# Altium footprint library Tomra_Cadstar_Footprints.PcbLib: 380 footprints (part 20 of 24)
Each footprint in its own frame and in the unit in brackets; x right, y up, seen from the top. Pads: shape width x height; smd on the part's side, far side on the other; paste and mask are expansions set on the pad; w line width, h text height; cw(c..) or ccw(c..) is an arc to the next point about the centre after c.
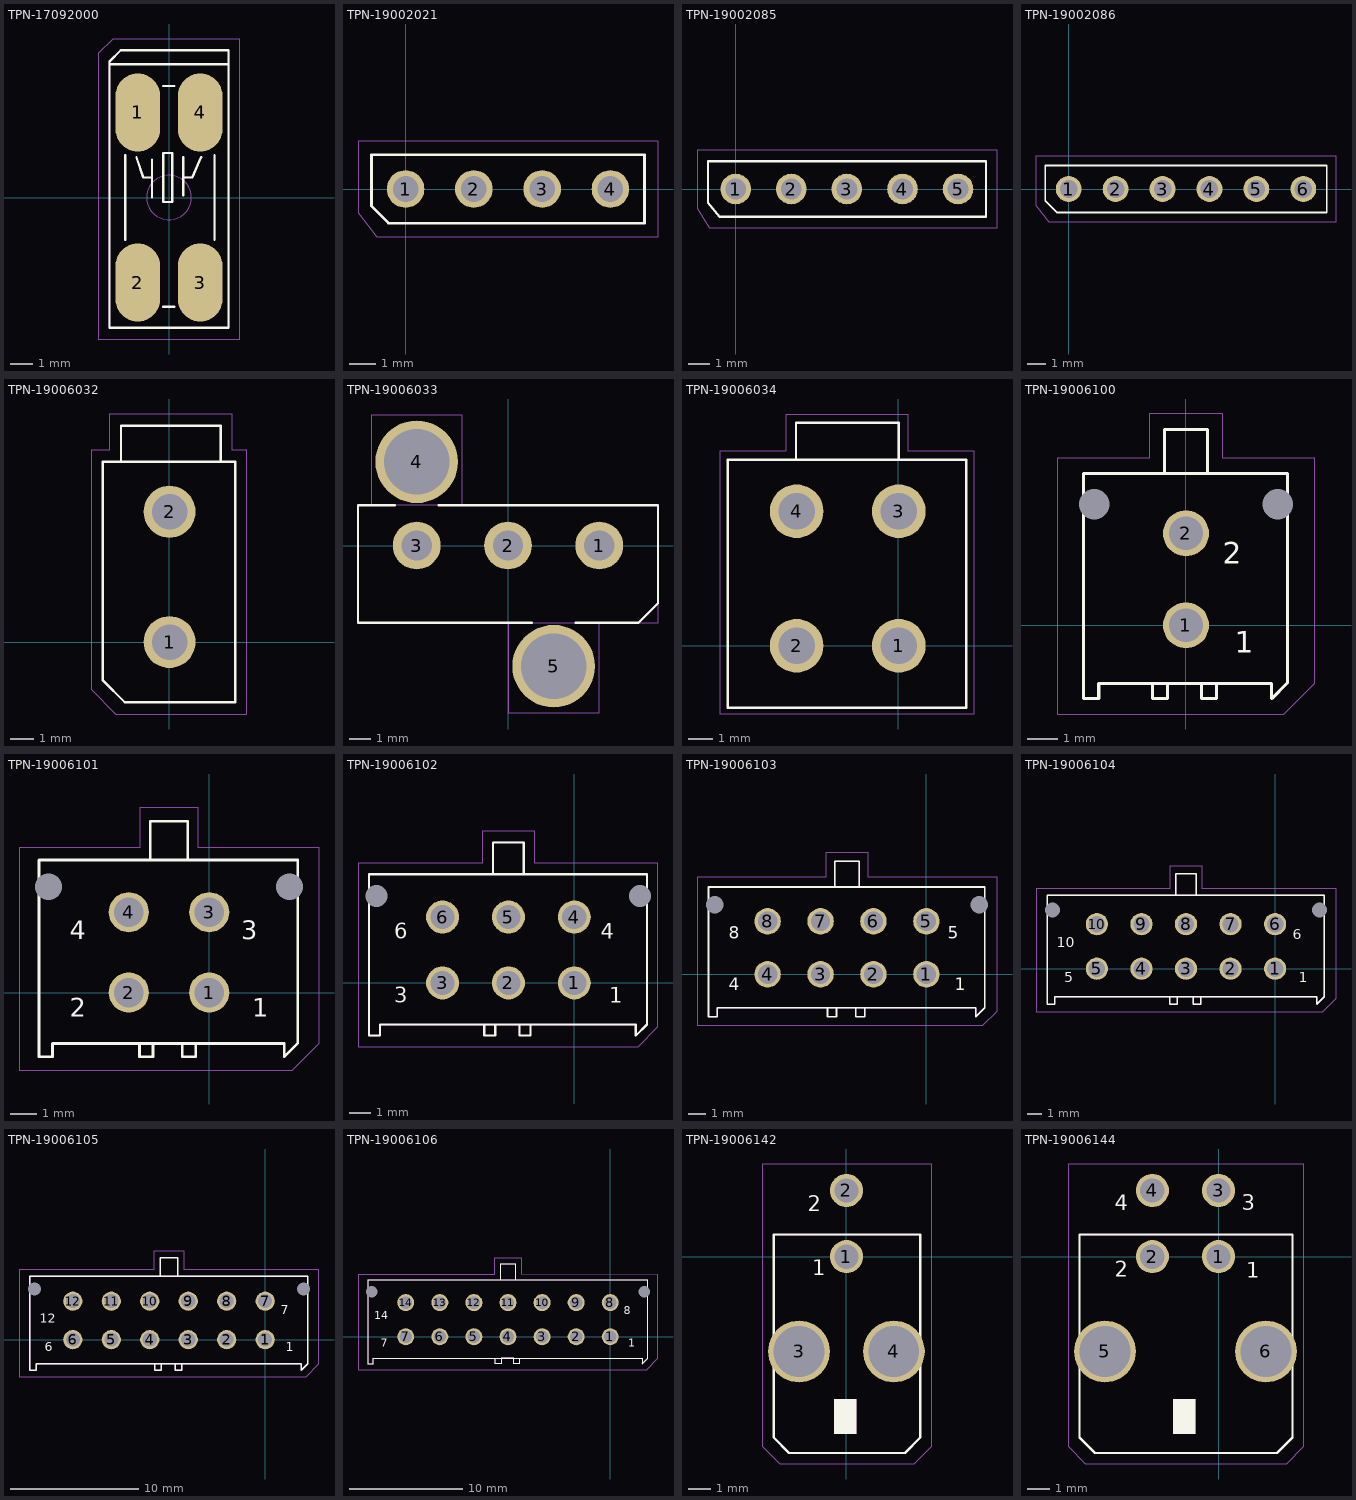
[diagram p19: the footprints below, top view; thin cyan lines are the x and y axes]

## TPN-17092000 [mm]
height 2.5
pads (4):
  oval 2x3.5 smd paste+0 mask+0: 1(-1.397,3.81) 2(-1.397,-3.81) 3(1.397,-3.81) 4(1.397,3.81)
Top Silk:
  lines w0.1: -1.957,-1.9 -1.957,1.9 ; -1.457,1.8 -1.157,0.9 -0.757,0.9 ; -0.757,0 -0.757,1.7 ; -0.257,-4.9 0.243,-4.9 ; -0.257,5 0.243,5 ; 0.643,0.1 0.643,1.8 ; 0.643,0.9 1.043,0.9 1.443,1.8 ; 2.043,-1.9 2.043,1.9 ; -2.667,6.1 -2.163,6.604 ; -2.667,6.1 -2.667,-5.842 2.667,-5.842 2.667,6.604 ; -2.667,6.1 -2.667,5.969 2.667,5.969 2.667,6.604 ; -2.667,6.1 -2.163,6.604 ; -2.163,6.604 2.667,6.604 ; -2.163,6.604 2.667,6.604 ; -0.257,-0.2 0.143,-0.2 0.143,2 -0.257,2 -0.257,-0.2
  text ".Designator" at -0.219,3.624 h0.7
Drill:
  lines w0.05: -1,0 cw(c0,0) 1,0 cw(c0,0) -1,0
Top Assembly:
  lines w0.05: -1.957,-1.9 -1.957,1.9 ; -1.457,1.8 -1.157,0.9 -0.757,0.9 ; -0.757,0 -0.757,1.7 ; -0.257,-4.9 0.243,-4.9 ; -0.257,5 0.243,5 ; 0.643,0.1 0.643,1.8 ; 0.643,0.9 1.043,0.9 1.443,1.8 ; 2.043,-1.9 2.043,1.9 ; -2.667,6.1 -2.667,5.969 2.667,5.969 2.667,6.604 ; -2.667,6.1 -2.163,6.604 ; -2.667,6.1 -2.163,6.604 ; -2.667,6.1 -2.667,-5.842 2.667,-5.842 2.667,6.604 ; -2.163,6.604 2.667,6.604 ; -2.163,6.604 2.667,6.604 ; -0.257,-0.2 0.143,-0.2 0.143,2 -0.257,2 -0.257,-0.2
Top Placement:
  lines w0.01: -3.167,-6.342 3.167,-6.342 3.167,7.104 -2.519,7.104 -3.167,6.456 -3.167,-6.342

## TPN-19002021 [mm]
height 9
pads (4):
  round 1.4 / inner round 1.524 / far side round 1.4 hole 0.95 paste+0 mask+0: 1(0,0) 2(2.54,0) 3(5.08,0) 4(7.62,0)
Top Silk:
  lines w0.1: -1.27,-0.635 -0.635,-1.27 8.89,-1.27 8.89,1.27 -1.27,1.27 -1.27,-0.635
  text ".Designator" at 0,0 h0.7
Top Assembly:
  lines w0.05: -1.27,-0.635 -0.635,-1.27 8.89,-1.27 8.89,1.27 -1.27,1.27 -1.27,-0.635
Top Placement:
  lines w0.01: -1.77,-0.885 -1.072,-1.77 9.39,-1.77 9.39,1.77 -1.77,1.77 -1.77,-0.885

## TPN-19002085 [mm]
height 9
pads (5):
  round 1.4 / inner round 1.524 / far side round 1.4 hole 0.95 paste+0 mask+0: 1(0,0) 2(2.54,0) 3(5.08,0) 4(7.62,0) 5(10.16,0)
Top Silk:
  lines w0.1: -1.27,-0.635 -0.74,-1.27 11.44,-1.27 11.44,1.27 -1.27,1.27 -1.27,-0.635
  text ".Designator" at 0,0 h0.7
Top Assembly:
  lines w0.05: -1.27,-0.635 -0.74,-1.27 11.44,-1.27 11.44,1.27 -1.27,1.27 -1.27,-0.635
Top Placement:
  lines w0.01: -1.77,-0.885 -1.199,-1.77 11.94,-1.77 11.94,1.77 -1.77,1.77 -1.77,-0.885

## TPN-19002086 [mm]
height 9
pads (6):
  round 1.4 / inner round 1.524 / far side round 1.4 hole 0.95 paste+0 mask+0: 1(0,0) 2(2.54,0) 3(5.08,0) 4(7.62,0) 5(10.16,0) 6(12.7,0)
Top Silk:
  lines w0.1: -1.27,-0.635 -0.635,-1.27 13.97,-1.27 13.97,1.27 -1.27,1.27 -1.27,-0.635
  text ".Designator" at 0,0 h0.7
Top Assembly:
  lines w0.05: -1.27,-0.635 -0.635,-1.27 13.97,-1.27 13.97,1.27 -1.27,1.27 -1.27,-0.635
Top Placement:
  lines w0.01: -1.77,-0.885 -1.093,-1.77 14.47,-1.77 14.47,1.77 -1.77,1.77 -1.77,-0.885

## TPN-19006032 [mm]
height 13
pads (2):
  round 2.2 / inner round 1.524 / far side round 2.2 hole 1.5 paste+0 mask+0: 1(0.025,0) 2(0.025,5.512)
Top Silk:
  lines w0.1: -2.794,-1.619 -1.873,-2.54 2.794,-2.54 2.794,7.62 -2.794,7.62 -2.794,-1.619 ; -2.032,7.62 2.184,7.62 2.184,9.144 -2.032,9.144 -2.032,7.62
  text ".Designator" at 0,0 h0.7
Top Assembly:
  lines w0.05: -2.794,-1.619 -1.873,-2.54 2.794,-2.54 2.794,7.62 -2.794,7.62 -2.794,-1.619 ; -2.032,7.62 2.159,7.62 2.159,9.144 -2.032,9.144 -2.032,7.62
Top Placement:
  lines w0.01: -3.294,-2 -2.254,-3.04 3.294,-3.04 3.294,8.12 2.684,8.12 2.684,9.644 -2.532,9.644 -2.532,8.12 -3.294,8.12 -3.294,-2

## TPN-19006033 [mm]
height 13
pads (5):
  round 2.2 / inner round 1.524 / far side round 2.2 hole 1.4 paste+0 mask+0: 1(4.2,0) 2(0,0) 3(-4.2,0)
  round 3.8 / inner round 1.524 / far side round 3.8 hole 3 paste+0 mask+0: 4(-4.2,3.85) 5(2.1,-5.55)
Top Silk:
  lines w0.1: -5.2,1.85 -6.9,1.85 -6.9,-3.55 1.1,-3.55 ; -3.2,1.85 6.9,1.85 6.9,-2.65 6,-3.55 3.1,-3.55
  text ".Designator" at -1.15,2.8 h0.7
Top Assembly:
  lines w0.05: -6.9,-3.55 6,-3.55 6.9,-2.65 6.9,1.85 -6.9,1.85 -6.9,-3.55
Top Placement:
  lines w0.01: -6.9,-3.55 -6.9,1.85 -6.3,1.85 -6.3,6 -2.1,6 -2.1,1.85 6.9,1.85 6.9,-3.55 4.2,-3.55 4.2,-7.7 0,-7.7 0,-3.55 -6.9,-3.55

## TPN-19006034 [mm]
height 12.8
pads (4):
  round 2.2 / inner round 1.524 / far side round 2.2 hole 1.5 paste+0 mask+0: 1(0.025,0) 2(-4.166,0) 3(0.025,5.512) 4(-4.166,5.512)
Top Silk:
  lines w0.1: -6.985,-2.54 2.794,-2.54 ; -6.985,-2.54 -6.985,7.62 ; -6.985,-2.54 2.794,-2.54 ; -6.985,-2.54 -6.985,7.62 ; -6.985,7.62 2.794,7.62 ; -6.985,7.62 2.794,7.62 ; -4.191,7.62 0.025,7.62 ; -4.191,7.62 -4.191,9.144 ; -4.191,7.62 0.025,7.62 ; -4.191,7.62 -4.191,9.144 ; -4.191,9.144 0.025,9.144 ; -4.191,9.144 0.025,9.144 ; 0.025,7.62 0.025,9.144 ; 0.025,7.62 0.025,9.144 ; 2.794,-2.54 2.794,7.62 ; 2.794,-2.54 2.794,7.62
  text ".Designator" at -7.3,8 h0.7
Top Assembly:
  lines w0.05: -6.985,-2.54 2.794,-2.54 2.794,7.62 -6.985,7.62 -6.985,-2.54 ; -4.191,7.62 0.025,7.62 0.025,9.144 -4.191,9.144 -4.191,7.62
Top Placement:
  lines w0.01: -7.3,-2.8 3.1,-2.8 3.1,8 0.4,8 0.4,9.5 -4.6,9.5 -4.6,8 -7.3,8 -7.3,-2.8

## TPN-19006100 [mm]
pads (4):
  round 1.5 / inner round 1.524 / far side round 1.5 hole 1.1 paste+0 mask+0: 1(0,0) 2(0,3)
  round 0 / inner round 1.524 / far side round 0 hole 1 unplated paste+0 mask+0: 3(3,3.95) 4(-3,3.95)
Top Silk:
  lines w0.1: -1.1,-1.9 -1.1,-2.4 -0.6,-2.4 -0.6,-1.9 0.5,-1.9 0.5,-2.4 1,-2.4 1,-1.9 ; -0.7,5 -0.7,6.4 0.7,6.4 0.7,5 ; -3.35,-2.4 -2.85,-2.4 -2.85,-1.9 2.8,-1.9 2.8,-2.4 3.31,-1.89 3.31,4.95 -3.35,4.95 -3.35,-2.4
  text "1" at 1.6,-0.9 h0.7
  text "2" at 1.2,2 h0.7
  text ".Designator" at 0,0 h0.7
Top Assembly:
  lines w0.05: -1.1,-1.9 -1.1,-2.4 -0.6,-2.4 -0.6,-1.9 0.5,-1.9 0.5,-2.4 1,-2.4 1,-1.9 ; -0.7,5 -0.7,6.4 0.7,6.4 0.7,5 ; -3.35,-2.4 -2.85,-2.4 -2.85,-1.9 2.8,-1.9 2.8,-2.4 3.31,-1.89 3.31,4.95 -3.35,4.95 -3.35,-2.4
Top Placement:
  lines w0.01: -4.2,-2.9 -4.2,5.45 -1.2,5.45 -1.2,6.9 1.2,6.9 1.2,5.45 4.2,5.45 4.2,-1.9 3.2,-2.9 -4.2,-2.9

## TPN-19006101 [mm]
height 9.8
pads (6):
  round 1.5 / inner round 1.524 / far side round 1.5 hole 1.1 paste+0 mask+0: 1(0,0) 2(-3,0) 3(0,3) 4(-3,3)
  round 0 / inner round 1.524 / far side round 0 hole 1 unplated paste+0 mask+0: 5(-6,3.95) 6(3,3.95)
Top Silk:
  lines w0.1: -2.6,-1.9 -2.6,-2.4 -2.1,-2.4 -2.1,-1.9 -1,-1.9 -1,-2.4 -0.5,-2.4 -0.5,-1.9 ; -2.2,5 -2.2,6.4 -0.8,6.4 -0.8,5 ; -6.35,-2.4 -5.85,-2.4 -5.85,-1.9 2.8,-1.9 2.8,-2.4 3.31,-1.89 3.31,4.95 -6.35,4.95 -6.35,-2.4
  text "1" at 1.6,-0.9 h0.7
  text "3" at 1.2,2 h0.7
  text "4" at -5.2,2 h0.7
  text "2" at -5.2,-0.9 h0.7
  text ".Designator" at 0,0 h0.7
Top Assembly:
  lines w0.05: -2.6,-1.9 -2.6,-2.4 -2.1,-2.4 -2.1,-1.9 -1,-1.9 -1,-2.4 -0.5,-2.4 -0.5,-1.9 ; -2.2,5 -2.2,6.4 -0.8,6.4 -0.8,5 ; -6.35,-2.4 -5.85,-2.4 -5.85,-1.9 2.8,-1.9 2.8,-2.4 3.31,-1.89 3.31,4.95 -6.35,4.95 -6.35,-2.4
  text "1" at 1.6,-0.9 h0.7
  text "3" at 1.2,2 h0.7
  text "4" at -5.2,2 h0.7
  text "2" at -5.2,-0.9 h0.7
Top Placement:
  lines w0.01: -7.1,-2.9 3.1,-2.9 4.1,-1.9 4.1,5.4 -0.4,5.4 -0.4,6.9 -2.6,6.9 -2.6,5.4 -7.1,5.4 -7.1,-2.9

## TPN-19006102 [mm]
pads (8):
  round 1.5 / inner round 1.524 / far side round 1.5 hole 1.1 paste+0 mask+0: 1(0,0) 2(-3,0) 3(-6,0) 4(0,3) 5(-3,3) 6(-6,3)
  round 0 / inner round 1.524 / far side round 0 hole 1 unplated paste+0 mask+0: 7(3,3.95) 8(-9,3.95)
Top Silk:
  lines w0.1: -4.1,-1.9 -4.1,-2.4 -3.6,-2.4 -3.6,-1.9 -2.5,-1.9 -2.5,-2.4 -2,-2.4 -2,-1.9 ; -3.7,5 -3.7,6.4 -2.3,6.4 -2.3,5 ; -9.35,-2.4 -8.85,-2.4 -8.85,-1.9 2.8,-1.9 2.8,-2.4 3.31,-1.89 3.31,4.95 -9.35,4.95 -9.35,-2.4
  text "1" at 1.6,-0.9 h0.7
  text "4" at 1.2,2 h0.7
  text "6" at -8.2,2 h0.7
  text "3" at -8.2,-0.9 h0.7
  text ".Designator" at 0,0 h0.7
Top Assembly:
  lines w0.05: -4.1,-1.9 -4.1,-2.4 -3.6,-2.4 -3.6,-1.9 -2.5,-1.9 -2.5,-2.4 -2,-2.4 -2,-1.9 ; -3.7,5 -3.7,6.4 -2.3,6.4 -2.3,5 ; -9.35,-2.4 -8.85,-2.4 -8.85,-1.9 2.8,-1.9 2.8,-2.4 3.31,-1.89 3.31,4.95 -9.35,4.95 -9.35,-2.4
Top Placement:
  lines w0.01: -9.85,-2.9 -9.85,5.45 -4.2,5.45 -4.2,6.9 -1.8,6.9 -1.8,5.45 3.81,5.45 3.81,-1.99 2.9,-2.9 -9.85,-2.9

## TPN-19006103 [mm]
height 9.8
pads (10):
  round 1.5 / inner round 1.524 / far side round 1.5 hole 1.1 paste+0 mask+0: 1(0,0) 2(-3,0) 3(-6,0) 4(-9,0) 5(0,3) 6(-3,3) 7(-6,3) 8(-9,3)
  round 0 / inner round 1.524 / far side round 0 hole 1 unplated paste+0 mask+0: 9(3,3.95) 10(-12,3.95)
Top Silk:
  lines w0.1: -5.6,-1.9 -5.6,-2.4 -5.1,-2.4 -5.1,-1.9 -4,-1.9 -4,-2.4 -3.5,-2.4 -3.5,-1.9 ; -5.2,5 -5.2,6.4 -3.8,6.4 -3.8,5 ; -12.35,-2.4 -11.85,-2.4 -11.85,-1.9 2.8,-1.9 2.8,-2.4 3.31,-1.89 3.31,4.95 -12.35,4.95 -12.35,-2.4
  text "1" at 1.6,-0.9 h0.7
  text "5" at 1.2,2 h0.7
  text "8" at -11.2,2 h0.7
  text "4" at -11.2,-0.9 h0.7
  text ".Designator" at 0,0 h0.7
Top Assembly:
  lines w0.05: -5.6,-1.9 -5.6,-2.4 -5.1,-2.4 -5.1,-1.9 -4,-1.9 -4,-2.4 -3.5,-2.4 -3.5,-1.9 ; -5.2,5 -5.2,6.4 -3.8,6.4 -3.8,5 ; -12.35,-2.4 -11.85,-2.4 -11.85,-1.9 2.8,-1.9 2.8,-2.4 3.31,-1.89 3.31,4.95 -12.35,4.95 -12.35,-2.4
Top Placement:
  lines w0.01: -13,-2.9 3.2,-2.9 4,-2.1 4,5.5 -3.3,5.5 -3.3,6.9 -5.7,6.9 -5.7,5.5 -13,5.5 -13,-2.9

## TPN-19006104 [mm]
height 10
pads (12):
  round 1.5 / inner round 1.524 / far side round 1.5 hole 1.1 paste+0 mask+0: 1(0,0) 2(-3,0) 3(-6,0) 4(-9,0) 5(-12,0) 6(0,3) 7(-3,3) 8(-6,3) 9(-9,3) 10(-12,3)
  round 0 / inner round 1.524 / far side round 0 hole 1 unplated paste+0 mask+0: 11(3,3.95) 12(-15,3.95)
Top Silk:
  lines w0.1: -7.1,-1.9 -7.1,-2.4 -6.6,-2.4 -6.6,-1.9 -5.5,-1.9 -5.5,-2.4 -5,-2.4 -5,-1.9 ; -6.7,5 -6.7,6.4 -5.3,6.4 -5.3,5 ; -15.35,-2.4 -14.85,-2.4 -14.85,-1.9 2.8,-1.9 2.8,-2.4 3.31,-1.89 3.31,4.95 -15.35,4.95 -15.35,-2.4
  text "1" at 1.6,-0.9 h0.7
  text "6" at 1.2,2 h0.7
  text "5" at -14.2,-0.9 h0.7
  text "10" at -14.7,1.45 h0.7
  text ".Designator" at 0,0 h0.7
Top Assembly:
  lines w0.05: -7.1,-1.9 -7.1,-2.4 -6.6,-2.4 -6.6,-1.9 -5.5,-1.9 -5.5,-2.4 -5,-2.4 -5,-1.9 ; -6.7,5 -6.7,6.4 -5.3,6.4 -5.3,5 ; -15.35,-2.4 -14.85,-2.4 -14.85,-1.9 2.8,-1.9 2.8,-2.4 3.31,-1.89 3.31,4.95 -15.35,4.95 -15.35,-2.4
Top Placement:
  lines w0.01: -16.1,-2.9 3.2,-2.9 4.1,-2 4.1,5.4 -4.9,5.4 -4.9,6.9 -7.1,6.9 -7.1,5.4 -16.1,5.4 -16.1,-2.9

## TPN-19006105 [mm]
pads (14):
  round 1.5 / inner round 1.524 / far side round 1.5 hole 1.1 paste+0 mask+0: 1(0,0) 2(-3,0) 3(-6,0) 4(-9,0) 5(-12,0) 6(-15,0) 7(0,3) 8(-3,3) 9(-6,3) 10(-9,3) 11(-12,3) 12(-15,3)
  round 0 / inner round 1.524 / far side round 0 hole 1 unplated paste+0 mask+0: 13(3,3.95) 14(-18,3.95)
Top Silk:
  lines w0.1: -8.6,-1.9 -8.6,-2.4 -8.1,-2.4 -8.1,-1.9 -7,-1.9 -7,-2.4 -6.5,-2.4 -6.5,-1.9 ; -8.2,5 -8.2,6.4 -6.8,6.4 -6.8,5 ; -18.35,-2.4 -17.85,-2.4 -17.85,-1.9 2.8,-1.9 2.8,-2.4 3.31,-1.89 3.31,4.95 -18.35,4.95 -18.35,-2.4
  text "1" at 1.6,-0.9 h0.7
  text "7" at 1.2,2 h0.7
  text "6" at -17.2,-0.9 h0.7
  text "12" at -17.6,1.3 h0.7
  text ".Designator" at 0,0 h0.7
Top Assembly:
  lines w0.05: -8.6,-1.9 -8.6,-2.4 -8.1,-2.4 -8.1,-1.9 -7,-1.9 -7,-2.4 -6.5,-2.4 -6.5,-1.9 ; -8.2,5 -8.2,6.4 -6.8,6.4 -6.8,5 ; -18.35,-2.4 -17.85,-2.4 -17.85,-1.9 2.8,-1.9 2.8,-2.4 3.31,-1.89 3.31,4.95 -18.35,4.95 -18.35,-2.4
Top Placement:
  lines w0.01: -19.2,-2.9 -19.2,5.45 -8.7,5.45 -8.7,6.9 -6.3,6.9 -6.3,5.45 4.2,5.45 4.2,-1.9 3.2,-2.9 -19.2,-2.9

## TPN-19006106 [mm]
pads (16):
  round 1.5 / inner round 1.524 / far side round 1.5 hole 1.1 paste+0 mask+0: 1(0,0) 2(-3,0) 3(-6,0) 4(-9,0) 5(-12,0) 6(-15,0) 7(-18,0) 8(0,3) 9(-3,3) 10(-6,3) 11(-9,3) 12(-12,3) 13(-15,3) 14(-18,3)
  round 0 / inner round 1.524 / far side round 0 hole 1 unplated paste+0 mask+0: 15(3,3.95) 16(-21,3.95)
Top Silk:
  lines w0.1: -10.1,-1.9 -10.1,-2.4 -9.6,-2.4 -9.6,-1.9 -8.5,-1.9 -8.5,-2.4 -8,-2.4 -8,-1.9 ; -9.7,5 -9.7,6.4 -8.3,6.4 -8.3,5 ; -21.35,-2.4 -20.85,-2.4 -20.85,-1.9 2.8,-1.9 2.8,-2.4 3.31,-1.89 3.31,4.95 -21.35,4.95 -21.35,-2.4
  text "1" at 1.6,-0.9 h0.7
  text "7" at -20.2,-0.9 h0.7
  text "14" at -20.75,1.55 h0.7
  text "8" at 1.2,2 h0.7
  text ".Designator" at 0,0 h0.7
Top Assembly:
  lines w0.05: -10.1,-1.9 -10.1,-2.4 -9.6,-2.4 -9.6,-1.9 -8.5,-1.9 -8.5,-2.4 -8,-2.4 -8,-1.9 ; -9.7,5 -9.7,6.4 -8.3,6.4 -8.3,5 ; -21.35,-2.4 -20.85,-2.4 -20.85,-1.9 2.8,-1.9 2.8,-2.4 3.31,-1.89 3.31,4.95 -21.35,4.95 -21.35,-2.4
Top Placement:
  lines w0.01: -22.2,-2.9 -22.2,5.45 -10.2,5.45 -10.2,6.9 -7.8,6.9 -7.8,5.5 4.2,5.45 4.2,-1.9 3.2,-2.9 -22.2,-2.9

## TPN-19006142 [mm]
pads (4):
  round 1.5 / inner round 1.524 / far side round 1.5 hole 1.1 paste+0 mask+0: 1(0,0) 2(0,3)
  round 2.8 / inner round 1.524 / far side round 2.8 hole 2.3 paste+0 mask+0: 3(-2.15,-4.3) 4(2.15,-4.3)
Top Silk:
  region: -0.55,-6.47 0.45,-6.47 0.45,-8.02 -0.55,-8.02
  lines w0.1: -3.3,-8.2 -2.6,-8.9 2.65,-8.9 3.35,-8.2 3.35,1 -3.3,1 -3.3,-8.2
  text "2" at -1.75,2.05 h0.7
  text "1" at -1.55,-0.85 h0.7
  text ".Designator" at 0,0 h0.7
Top Assembly:
  region: -0.55,-6.47 0.45,-6.47 0.45,-8.02 -0.55,-8.02
  lines w0.05: -3.3,-8.2 -2.6,-8.9 2.65,-8.9 3.35,-8.2 3.35,1 -3.3,1 -3.3,-8.2
  text "2" at -1.75,2.05 h0.7
  text "1" at -1.55,-0.85 h0.7
Top Placement:
  lines w0.01: -3.8,-8.629 -2.995,-9.4 3.045,-9.4 3.85,-8.629 3.85,4.2 -3.8,4.2 -3.8,-8.629

## TPN-19006144 [mm]
height 10
pads (6):
  round 1.5 / inner round 1.524 / far side round 1.5 hole 1.1 paste+0 mask+0: 1(0,0) 2(-3,0) 3(0,3) 4(-3,3)
  round 2.8 / inner round 1.524 / far side round 2.8 hole 2.3 paste+0 mask+0: 5(-5.15,-4.3) 6(2.15,-4.3)
Top Silk:
  region: -2.05,-6.47 -1.05,-6.47 -1.05,-8.02 -2.05,-8.02
  lines w0.1: -6.3,-8.2 -5.6,-8.9 2.65,-8.9 3.35,-8.2 3.35,1 -6.3,1 -6.3,-8.2
  text "1" at 1.25,-0.95 h0.7
  text "2" at -4.7,-0.9 h0.7
  text "3" at 1.05,2.1 h0.7
  text "4" at -4.7,2.1 h0.7
  text ".Designator" at 0,0 h0.7
Top Assembly:
  region: -2.05,-6.47 -1.05,-6.47 -1.05,-8.02 -2.05,-8.02
  lines w0.05: -6.3,-8.2 -5.6,-8.9 2.65,-8.9 3.35,-8.2 3.35,1 -6.3,1 -6.3,-8.2
  text "1" at 1.25,-0.95 h0.7
  text "2" at -4.7,-0.9 h0.7
  text "3" at 1.05,2.1 h0.7
  text "4" at -4.7,2.1 h0.7
Top Placement:
  lines w0.01: -6.8,-8.629 -6.027,-9.4 3.077,-9.4 3.85,-8.629 3.85,4.2 -6.8,4.2 -6.8,-8.629